# Altium footprint library MainFPs.PcbLib: 206 footprints (part 2 of 13)
Each footprint in its own frame and in the unit in brackets; x right, y up, seen from the top. Pads: shape width x height; smd on the part's side, far side on the other; paste and mask are expansions set on the pad; w line width, h text height; cw(c..) or ccw(c..) is an arc to the next point about the centre after c.
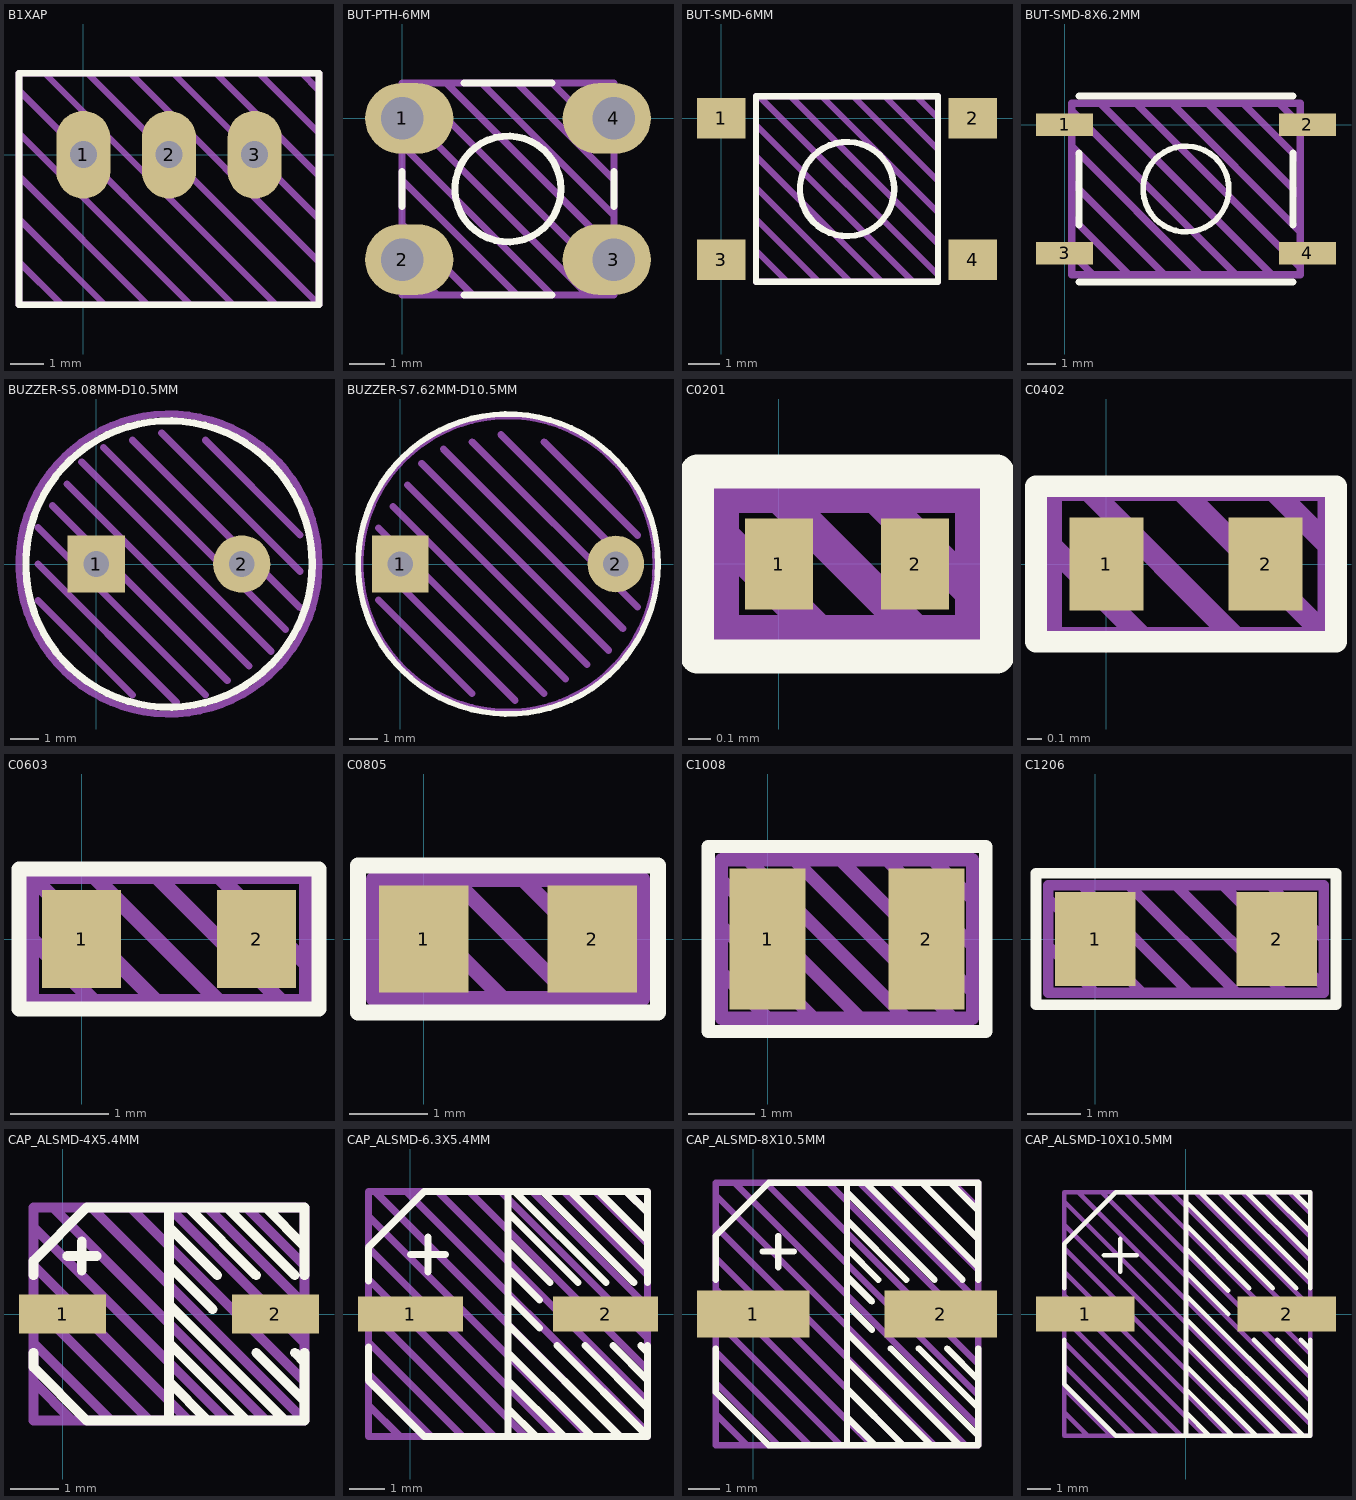
[diagram p1: the footprints below, top view; thin cyan lines are the x and y axes]

## B1XAP [mm] "NKK Switches B-Series Toggle Switch"
pads (3):
  oval 1.6x2.6 hole 0.8: 1(0,0) 2(2.54,0) 3(5.08,0)
Top Overlay:
  lines w0.2: -1.905,-4.445 -1.905,2.413 6.985,2.413 6.985,-4.445 -1.905,-4.445
Draw:
  lines w0.2: -1.905,-3.175 -0.635,-4.445 ; -1.905,-1.905 0.635,-4.445 ; -1.905,-0.635 1.905,-4.445 ; -1.905,0.635 3.175,-4.445 ; -1.905,1.905 4.445,-4.445 ; -1.143,2.413 5.715,-4.445 ; 0.127,2.413 6.985,-4.445 ; 1.397,2.413 6.985,-3.175 ; 2.667,2.413 6.985,-1.905 ; 3.937,2.413 6.985,-0.635 ; 5.207,2.413 6.985,0.635 ; 6.477,2.413 6.985,1.905 ; 6.985,-4.445 -1.905,-4.445 -1.905,2.413 6.985,2.413 6.985,-4.445
Info:
  text "'.Comment'" at -1.709,-5.917 h1
3D body "B13AP.stp": height 22.89, standoff -3.1, extent -1.854,-4.42 6.934,2.388

## BUT-PTH-6MM [mm]
pads (4):
  oval 2.5x2 hole 1.2 copper offset 0.2,0: 1(0,0) 2(0,-4)
  oval 2.5x2 hole 1.2 copper offset -0.2,0: 3(6,-4) 4(6,0)
Top Overlay:
  circle w0.2: c3,-2 r1.5
  lines w0.2: 0,-2.5 0,-1.5 ; 1.75,-5 4.25,-5 ; 1.75,1 4.25,1 ; 6,-2.5 6,-1.5
Draw:
  lines w0.2: 0,-4 1,-5 ; 0,-3 2,-5 ; 0,-1.75 3.25,-5 ; 0,-0.75 4.25,-5 ; 0,0.25 5.25,-5 ; 0.25,1 6,-4.75 ; 1.25,1 6,-3.75 ; 2.25,1 6,-2.75 ; 3.25,1 6,-1.75 ; 4.25,1 6,-0.75 ; 5.25,1 6,0.25 ; 0,-5 6,-5 6,1 0,1 0,-5
Info:
  text "'.Comment'" at -1.249,-6.833 h1
3D body: height 4.6, standoff 3.8, extent 1.494,-3.5 4.494,-0.5
3D body: height 2, standoff -0.03, extent 5.456,-0.4 6.197,0.4
3D body: height 2, standoff -0.03, extent 5.456,-4.4 6.197,-3.6
3D body: height 2, standoff -0.03, extent -0.197,-4.4 0.544,-3.6
3D body: height 3.8, standoff 3.5, extent 0,-5 6,1
3D body: height 3.5, standoff 0.3, extent 0,-5 6,1
3D body: height 4, standoff 3.8, extent 0.498,-0.5 1.498,0.5
3D body: height 4, standoff 3.8, extent 0.498,-4.5 1.498,-3.5
3D body: height 4, standoff 3.8, extent 4.5,-4.5 5.5,-3.5
3D body: height 4, standoff 3.8, extent 4.5,-0.5 5.5,0.5
3D body: height 2, standoff -0.03, extent -0.197,-0.4 0.544,0.4
3D body: height -1.38, standoff -3.87, extent 4.969,-4.4 6.2,-3.6
3D body: height -1.38, standoff -3.87, extent -0.2,-4.4 1.031,-3.6
3D body: height -1.38, standoff -3.87, extent -0.2,-0.4 1.031,0.4
3D body: height -1.38, standoff -3.87, extent 4.969,-0.4 6.2,0.4

## BUT-SMD-6MM [mm]
pads (4):
  rect 1.55x1.3 smd: 1(0,0) 2(8,0) 3(0,-4.5) 4(8,-4.5)
Top Overlay:
  circle w0.2: c4,-2.25 r1.5
  lines w0.2: 1.1,-5.2 1.1,0.7 6.9,0.7 6.9,-5.2 1.1,-5.2
Draw:
  lines w0.2: 1.1,-4.2 2.1,-5.2 ; 1.1,-3.2 3.1,-5.2 ; 1.1,-2.2 4.1,-5.2 ; 1.1,-1.2 5.1,-5.2 ; 1.1,-0.2 6.1,-5.2 ; 1.2,0.7 6.9,-5 ; 2.2,0.7 6.9,-4 ; 3.2,0.7 6.9,-3 ; 4.2,0.7 6.9,-2 ; 5.2,0.7 6.9,-1 ; 6.2,0.7 6.9,0 ; 1.1,-5.2 1.1,0.7 6.9,0.7 6.9,-5.2 1.1,-5.2
Info:
  text "'.Comment'" at -0.249,-6.833 h1
3D body "TS6-SMT_H-4.3.step": height 4.3, standoff 0, extent 0,-5.25 8,0.75

## BUT-SMD-8X6.2MM [mm] "FSM1LP"
pads (4):
  rect 2x0.8 smd: 1(0,0) 2(8.5,0) 3(0,-4.5) 4(8.5,-4.5)
Top Overlay:
  circle w0.2: c4.25,-2.25 r1.5
  lines w0.25: 0.5,-5.5 8,-5.5 ; 0.5,-3.5 0.5,-1 ; 0.5,1 8,1 ; 8,-3.5 8,-1
Draw:
  lines w0.25: 0.25,-4.5 1,-5.25 ; 0.25,-3.25 2.25,-5.25 ; 0.25,-2 3.5,-5.25 ; 0.25,-0.75 4.75,-5.25 ; 0.25,0.5 6,-5.25 ; 1.25,0.75 7.25,-5.25 ; 2.5,0.75 8.25,-5 ; 3.75,0.75 8.25,-3.75 8.25,-4.5 ; 5,0.75 8.25,-2.5 ; 6.25,0.75 8.25,-1.25 8.25,-2.5 ; 7.5,0.75 8.25,0 8.25,-0.5 ; 8.25,-3 8.25,-2.5 ; 0.25,-5.25 0.25,0.75 8.25,0.75 8.25,-5.25 0.25,-5.25
Info:
  text "'.Comment'" at 0.001,-7.083 h1
3D body: height 0.3, standoff 0, extent -0.5,-0.3 0.7,0.3
3D body: height 0.3, standoff 0, extent -0.5,-4.8 0.7,-4.2
3D body: height 0.3, standoff 0, extent 7.8,-4.8 9,-4.2
3D body: height 0.3, standoff 0, extent 7.8,-0.3 9,0.3
3D body: height 2.1, standoff 1.9, extent 2.65,-3.85 5.85,-0.65
3D body: height 1, standoff 0, extent 0.65,-5.2 7.85,0.7
3D body: height 2, standoff 0.4, extent 0.55,-5.3 0.65,0.8
3D body: height 2, standoff 0.4, extent 0.55,-5.3 7.95,-5.2
3D body: height 2, standoff 0.4, extent 0.55,0.7 7.95,0.8
3D body: height 2, standoff 0.4, extent 7.85,-5.3 7.95,0.8
3D body: height 2, standoff 0.4, extent 0.55,-5.3 7.95,0.8

## BUZZER-S5.08MM-D10.5MM [mm]
pads (2):
  rect 2x2 hole 0.9: 1(0,0)
  round 2 hole 0.9: 2(5.08,0)
Top Overlay:
  circle w0.25: c2.54,0 r5
Draw:
  circle w0.25: c2.54,0 r5.236
  lines w0.25: -2.032,-1.27 1.27,-4.572 ; -2.032,0 2.794,-4.826 ; -2.032,1.27 3.81,-4.572 ; -1.524,2.032 4.572,-4.064 ; -1.016,2.794 5.334,-3.556 ; -0.508,3.556 6.096,-3.048 ; 0.254,4.064 6.604,-2.286 ; 1.27,4.318 7.112,-1.524 ; 2.286,4.572 7.112,-0.254 ; 3.81,4.318 7.112,1.016
Info:
  text "'.Comment'" at -1.749,-6.783 h1
3D body: height 6, standoff 0, extent -2.76,-5.297 7.84,5.297
3D body: height 5.55, standoff 5.5, extent 1.537,-1 3.537,1
3D body: height -0.97, standoff -3, extent 4.68,-0.4 5.48,0.4
3D body: height -0.97, standoff -3, extent -0.402,-0.4 0.398,0.4

## BUZZER-S7.62MM-D10.5MM [mm]
pads (2):
  rect 2x2 hole 0.9: 1(0,0)
  round 2 hole 0.9: 2(7.62,0)
Top Overlay:
  circle w0.2: c3.81,0 r5.3
Draw:
  circle w0.25: c3.81,0 r5.236
  lines w0.25: -0.762,-1.27 2.54,-4.572 ; -0.762,0 4.064,-4.826 ; -0.762,1.27 5.08,-4.572 ; -0.254,2.032 5.842,-4.064 ; 0.254,2.794 6.604,-3.556 ; 0.762,3.556 7.366,-3.048 ; 1.524,4.064 7.874,-2.286 ; 2.54,4.318 8.382,-1.524 ; 3.556,4.572 8.382,-0.254 ; 5.08,4.318 8.382,1.016
Info:
  text "'.Comment'" at -0.449,-6.783 h1
3D body: height 6, standoff 0, extent -1.49,-5.297 9.11,5.297
3D body: height 5.55, standoff 5.5, extent 2.807,-1 4.807,1
3D body: height -1, standoff -3, extent 7.22,-0.4 8.02,0.4
3D body: height -1, standoff -3, extent -0.4,-0.4 0.4,0.4

## C0201 [mm]
height 0.3
pads (2):
  rect 0.3x0.4 smd: 1(0,0) 2(0.6,0)
Top Overlay:
  lines w0.15: -0.361,-0.407 0.96,-0.407 0.96,0.381 0.96,0.406 -0.361,0.406 -0.361,-0.407
Draw:
  lines w0.15: -0.25,0.125 0.175,-0.3 ; 0,0.3 0.6,-0.3 ; 0.425,0.3 0.85,-0.125 ; -0.25,-0.3 0.85,-0.3 0.85,0.3 -0.25,0.3 -0.25,-0.3
Info:
  text "'.Comment'" at -0.762,-0.821 h0.25
3D body "C0201.step": height 0.3, standoff 0, extent 0,-0.15 0.6,0.15

## C0402 [mil]
pads (2):
  rect 20x25 smd: 1(0,0) 2(43,0)
Top Overlay:
  lines w5.91: -19,-21 62,-21 62,21 -19,21 -19,-21
Draw:
  lines w5.91: -15,5 10,-20 ; -5,20 35,-20 ; 20,20 60,-20 ; 45,20 60,5 ; 60,-20 -15,-20 -15,20 60,20 60,-20
Info:
  text "'.Comment'" at -38.86,-43.47 h13.78
3D body "Chip2PinSM127P600-8N111.step": height 13.78, standoff 0, extent 1.97,-9.84 41.34,9.85

## C0603 [mm]
pads (2):
  rect 0.8x1 smd: 1(0,0) 2(1.778,0)
Top Overlay:
  lines w0.15: -0.635,-0.711 -0.635,0.711 2.413,0.711 2.413,-0.711 -0.635,-0.711
Draw:
  lines w0.15: -0.508,0 0.127,-0.635 ; 0.127,0.635 1.397,-0.635 ; 0.762,-0.635 -0.508,0.635 ; 0.762,0.635 2.032,-0.635 ; 1.397,0.635 2.286,-0.254 ; -0.508,0.635 -0.508,-0.635 2.286,-0.635 2.286,0.635 -0.508,0.635
Info:
  text "'.Comment'" at -1.224,-1.492 h0.5
3D body "Chip2PinSM127P600-8N.step": height 0.8, standoff 0, extent -0.011,-0.45 1.789,0.45

## C0805 [mil]
pads (2):
  rect 45x54 smd: 1(0,0) 2(85,0)
Top Overlay:
  lines w7.87: -33,-37 -33,37 118,37 118,-37 -33,-37
Draw:
  lines w7.87: -25,0 5,-30 ; -20,30 40,-30 ; 15,30 75,-30 ; 35,-30 42.5,-30 ; 50,30 110,-30 ; 85,30 110,5 ; 110,-30 110,30 -25,30 -25,-30 110,-30
Info:
  text "'.Comment'" at -82.14,-84.15 h29.53
3D body "Chip2PinSM127P600-8N111111.step": height 23.62, standoff 0, extent 3.63,-23.62 82.37,23.63

## C1008 [mm]
pads (2):
  rect 1.15x2.14 smd: 1(0,0) 2(2.4,0)
Top Overlay:
  lines w0.2: -0.9,-1.4 3.3,-1.4 3.3,1.4 -0.9,1.4 -0.9,-1.4
Draw:
  lines w0.2: -0.7,-0.5 0,-1.2 ; -0.7,0.2 0.7,-1.2 ; -0.7,0.9 1.4,-1.2 ; -0.3,1.2 2.1,-1.2 ; 0.4,1.2 2.8,-1.2 ; 1.1,1.2 3.1,-0.8 ; 1.8,1.2 3.1,-0.1 ; 2.5,1.2 3.1,0.6 ; -0.7,-1.2 3.1,-1.2 3.1,1.2 -0.7,1.2 -0.7,-1.2
Info:
  text "'.Comment'" at -1.986,-2.537 h0.75
3D body "CAPC2520X09N.step": height 0.9, standoff 0, extent -0.05,-1 2.45,1

## C1206 [mil]
pads (2):
  rect 60x70 smd: 1(0,0) 2(135,0)
Top Overlay:
  lines w7.87: -44,-49 -44,49 179,49 179,-49 -44,-49
Draw:
  lines w7.87: -35,-5 0,-40 ; -35,30 35,-40 ; -10,40 70,-40 ; 25,40 105,-40 ; 60,40 140,-40 ; 95,40 170,-35 ; 130,40 170,0 ; -35,-40 -35,40 170,40 170,-40 -35,-40
Info:
  text "'.Comment'" at -58.52,-95.96 h29.53
3D body "Chip2PinSM127P600-8N.step": height 23.62, standoff 0, extent 5.01,-31.49 131,31.5

## CAP_ALSMD-4X5.4MM [mm]
height 5.4
pads (2):
  rect 1.8x0.8 smd: 1(0,0) 2(4.4,0)
Top Overlay:
  lines w0.2: -0.6,-0.8 -0.6,-1.1 0.5,-2.2 5,-2.2 5,-0.8 ; -0.6,0.8 -0.6,1.1 0.5,2.2 5,2.2 5,0.8 ; 0.1,1.2 0.7,1.2 ; 0.4,0.9 0.4,1.5 ; 2.2,-2.2 2.2,2.2 ; 2.2,-1.4 3,-2.2 ; 2.2,-0.6 3.8,-2.2 ; 2.2,0.2 4.6,-2.2 ; 2.2,1 3.1,0.1 ; 2.2,1.8 3.2,0.8 ; 2.6,2.2 4,0.8 ; 3.4,2.2 4.8,0.8 ; 4,-0.8 5,-1.8 ; 4.2,2.2 5,1.4 ; 4.8,-0.8 5,-1
Draw:
  lines w0.2: -0.6,-1.4 0.2,-2.2 ; -0.6,-0.6 1,-2.2 ; -0.6,0.2 1.8,-2.2 ; -0.6,1 2.6,-2.2 ; -0.6,1.8 3.4,-2.2 ; -0.2,2.2 4.2,-2.2 ; 0.6,2.2 5,-2.2 ; 1.4,2.2 5,-1.4 ; 2.2,2.2 5,-0.6 ; 3,2.2 5,0.2 ; 3.8,2.2 5,1 ; 5,-2.2 5,2.2 -0.6,2.2 -0.6,-2.2 5,-2.2
Info:
  text "'.Comment'" at -0.986,-3.337 h0.75
3D body "CAP-ALSMD-4x5.4.step": height 5.4, standoff 0, extent -0.7,-2.15 5.1,2.15

## CAP_ALSMD-6.3X5.4MM [mm]
height 6.3
pads (2):
  rect 3x1 smd: 1(0,0) 2(5.588,0)
Top Overlay:
  lines w0.2: -1.206,-0.95 -1.206,-1.9 0.394,-3.5 6.794,-3.5 ; -1.206,0.95 -1.206,1.9 0.394,3.5 6.794,3.5 6.794,0.9 ; 0,1.7 1,1.7 ; 0.5,1.2 0.5,2.2 ; 2.794,-3.5 2.794,3.5 ; 2.794,-2.7 3.594,-3.5 ; 2.794,-1.9 4.394,-3.5 ; 2.794,-1.1 5.194,-3.5 ; 2.794,-0.3 5.994,-3.5 ; 2.794,0.5 3.694,-0.4 ; 2.794,1.3 3.694,0.4 ; 2.794,2.1 3.994,0.9 ; 2.794,2.9 4.794,0.9 ; 2.994,3.5 5.594,0.9 ; 3.794,3.5 6.394,0.9 ; 4.194,-0.9 6.794,-3.5 ; 4.594,3.5 6.794,1.3 ; 4.994,-0.9 6.794,-2.7 ; 5.394,3.5 6.794,2.1 ; 5.794,-0.9 6.794,-1.9 ; 6.194,3.5 6.794,2.9 ; 6.594,-0.9 6.794,-1.1 ; 6.794,-2.5 6.794,-2.25 ; 6.794,-1.75 6.794,-1.5 ; 6.794,-0.9 6.794,-3.5
Draw:
  lines w0.2: -1.206,-2.6 -0.306,-3.5 ; -1.206,-1.7 0.594,-3.5 ; -1.206,-0.8 1.494,-3.5 ; -1.206,0.1 2.394,-3.5 ; -1.206,1 3.294,-3.5 ; -1.206,1.9 4.194,-3.5 ; -1.206,2.8 5.094,-3.5 ; -1.006,3.5 5.994,-3.5 ; -0.106,3.5 6.794,-3.4 ; 0.794,3.5 6.794,-2.5 ; 1.694,3.5 6.794,-1.6 ; 2.594,3.5 6.794,-0.7 ; 3.494,3.5 6.794,0.2 ; 4.394,3.5 6.794,1.1 ; 5.294,3.5 6.794,2 ; 6.194,3.5 6.794,2.9 ; -1.206,-3.5 -1.206,3.5 6.794,3.5 6.794,-3.5 -1.206,-3.5
Info:
  text "'.Comment'" at -1.455,-4.983 h1
3D body "CAP-ALSMD-6.3x5.4.step": height 6.3, standoff 0, extent -1.331,-3.4 6.919,3.4

## CAP_ALSMD-8X10.5MM [mm]
height 10.5
pads (2):
  rect 3.6x1.5 smd: 1(0,0) 2(6,0)
Top Overlay:
  lines w0.2: -1.2,-1.1 -1.2,-2.5 0.5,-4.2 3,-4.2 ; -1.2,1.1 -1.2,2.5 0.5,4.2 3,4.2 ; 0.3,2 1.3,2 ; 0.8,1.5 0.8,2.5 ; 3,-3.3 3.9,-4.2 ; 3,-2.4 4.8,-4.2 ; 3,-1.5 5.7,-4.2 ; 3,-0.6 6.6,-4.2 ; 3,0.3 3.8,-0.5 ; 3,1.2 3.8,0.4 ; 3,2.1 4,1.1 ; 3,3 4.9,1.1 ; 3,3.9 5.8,1.1 ; 3.6,4.2 6.7,1.1 ; 4.4,-1.1 7.2,-3.9 ; 4.5,4.2 7.2,1.5 ; 5.3,-1.1 7.2,-3 ; 5.4,4.2 7.2,2.4 ; 6.2,-1.1 7.2,-2.1 ; 6.3,4.2 7.2,3.3 ; 7.2,-1.1 7.2,-4.2 3,-4.2 ; 7.2,1.1 7.2,4.2 3,4.2 ; 3,-4.2 3,4.2
Draw:
  lines w0.2: -1.2,-3.2 -0.2,-4.2 ; -1.2,-2.2 0.8,-4.2 ; -1.2,-1.2 1.8,-4.2 ; -1.2,-0.2 2.8,-4.2 ; -1.2,0.8 3.8,-4.2 ; -1.2,1.8 4.8,-4.2 ; -1.2,2.8 5.8,-4.2 ; -1.2,3.8 6.8,-4.2 ; -0.6,4.2 7.2,-3.6 ; 0.4,4.2 7.2,-2.6 ; 1.4,4.2 7.2,-1.6 ; 2.4,4.2 7.2,-0.6 ; 3.4,4.2 7.2,0.4 ; 4.4,4.2 7.2,1.4 ; 5.4,4.2 7.2,2.4 ; 6.4,4.2 7.2,3.4 ; -1.2,-4.2 7.2,-4.2 7.2,4.2 -1.2,4.2 -1.2,-4.2
Info:
  text "'.Comment'" at -2.311,-6.029 h1.25
3D body "CAP-ALSMD-8x10x5.step": height 10.5, standoff 0, extent -1.375,-4.15 7.375,4.15

## CAP_ALSMD-10X10.5MM [mm]
height 11
pads (2):
  rect 4.2x1.5 smd: 1(-4.3,0) 2(4.3,0)
Top Overlay:
  lines w0.2: -5.2,-1.1 -5.2,-3 -3,-5.2 5.3,-5.2 5.3,-1.1 ; -5.2,1.1 -5.2,3 -3,5.2 5.3,5.2 5.3,1.1 ; -3.5,2.5 -2.1,2.5 ; -2.8,1.8 -2.8,3.2 ; 0,-5.2 0,5.2 ; 0,-4.2 1,-5.2 ; 0,-3.2 2,-5.2 ; 0,-2.2 3,-5.2 ; 0,-1.2 4,-5.2 ; 0,-0.2 5,-5.2 ; 0,0.8 5.3,-4.5 ; 0,1.8 1.8,0 ; 0,2.8 1.8,1 ; 0,3.8 2.7,1.1 ; 0,4.8 3.7,1.1 ; 0.6,5.2 4.7,1.1 ; 1.6,5.2 5.3,1.5 ; 2.6,5.2 5.3,2.5 ; 2.9,-1.1 5.3,-3.5 ; 3.6,5.2 5.3,3.5 ; 3.9,-1.1 5.3,-2.5 ; 4.6,5.2 5.3,4.5 ; 4.9,-1.1 5.3,-1.5
Draw:
  lines w0.2: -5.2,-4.2 -4.2,-5.2 ; -5.2,-3.2 -3.2,-5.2 ; -5.2,-2.2 -2.2,-5.2 ; -5.2,-1.2 -1.2,-5.2 ; -5.2,-0.2 -0.2,-5.2 ; -5.2,0.8 0.8,-5.2 ; -5.2,1.8 1.8,-5.2 ; -5.2,2.8 2.8,-5.2 ; -5.2,3.8 3.8,-5.2 ; -5.2,4.8 4.8,-5.2 ; -4.6,5.2 5.3,-4.7 ; -3.6,5.2 5.3,-3.7 ; -2.6,5.2 5.3,-2.7 ; -1.6,5.2 5.3,-1.7 ; -0.6,5.2 5.3,-0.7 ; 0.4,5.2 5.3,0.3 ; 1.4,5.2 5.3,1.3 ; 2.4,5.2 5.3,2.3 ; 3.4,5.2 5.3,3.3 ; 4.4,5.2 5.3,4.3 ; -5.2,-5.2 5.3,-5.2 5.3,5.2 -5.2,5.2 -5.2,-5.2
Info:
  text "'.Comment'" at -6.673,-7.675 h1.5
3D body "CAP-ALSMD-10x10.5.step": height 11, standoff 0, extent -5.375,-5.2 5.375,5.2